# Altium footprint library SAMV71_Xplained_Ultra1.PcbLib: 63 footprints (part 4 of 4)
Each footprint in its own frame and in the unit in brackets; x right, y up, seen from the top. Pads: shape width x height; smd on the part's side, far side on the other; paste and mask are expansions set on the pad; w line width, h text height; cw(c..) or ccw(c..) is an arc to the next point about the centre after c.
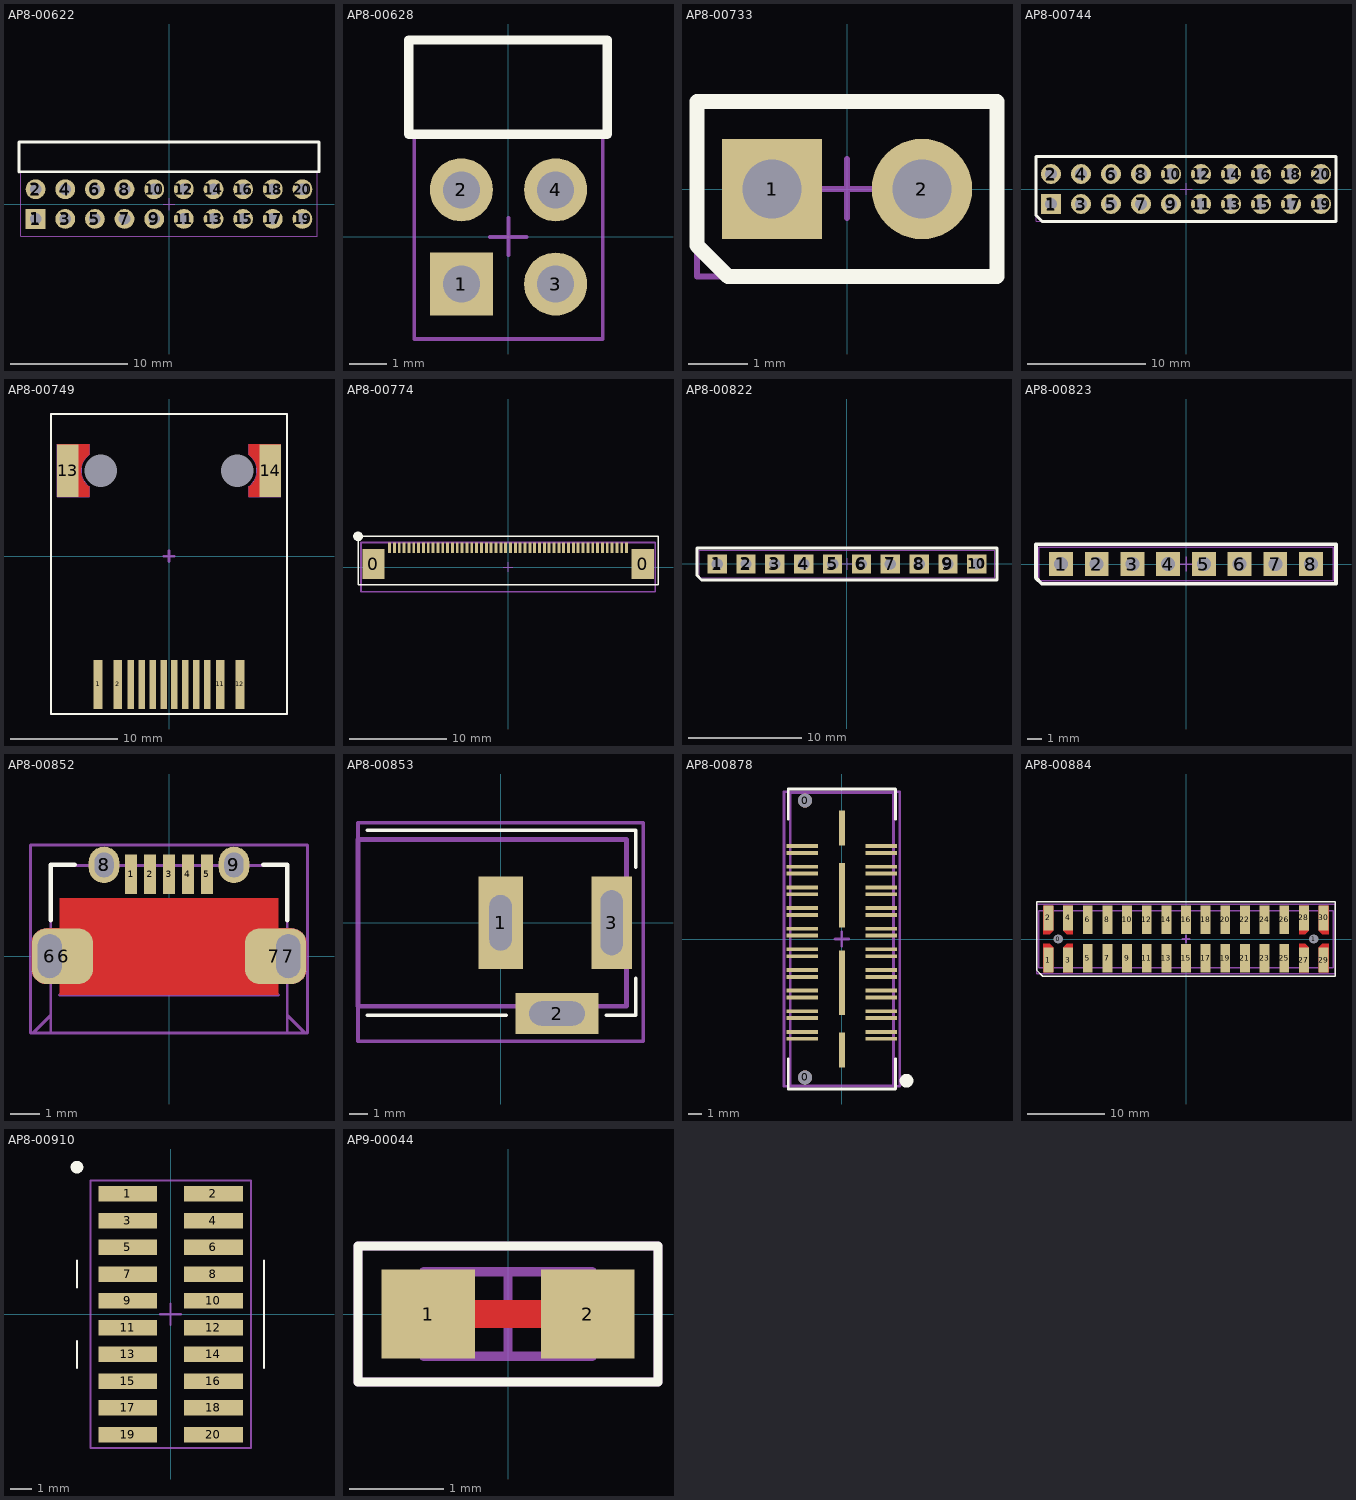
[diagram p3: the footprints below, top view; thin cyan lines are the x and y axes]

## AP8-00525 [mm]
3D body: height 8.97, standoff 3, extent -2.49,-1.22 2.49,1.22

## AP8-00622 [mm]
pads (40):
  rect 1.7x1.7 / inner round 1.7 / far side rect 1.7x1.7 hole 1: 1(-11.43,-1.27)
  rect 2.1x2.1 on Top Paste: 1(-11.43,-1.27) 2(-11.43,1.27) 3(-8.89,-1.27) 4(-8.89,1.27) 5(-6.35,-1.27) 6(-6.35,1.27) 7(-3.81,-1.27) 8(-3.81,1.27) 9(-1.27,-1.27) 10(-1.27,1.27) 11(1.27,-1.27) 12(1.27,1.27) 13(3.81,-1.27) 14(3.81,1.27) 15(6.35,-1.27) 16(6.35,1.27) 17(8.89,-1.27) 18(8.89,1.27) 19(11.43,-1.27) 20(11.43,1.27)
  round 1.7 hole 1: 2(-11.43,1.27) 3(-8.89,-1.27) 4(-8.89,1.27) 5(-6.35,-1.27) 6(-6.35,1.27) 7(-3.81,-1.27) 8(-3.81,1.27) 9(-1.27,-1.27) 10(-1.27,1.27) 11(1.27,-1.27) 12(1.27,1.27) 13(3.81,-1.27) 14(3.81,1.27) 15(6.35,-1.27) 16(6.35,1.27) 17(8.89,-1.27) 18(8.89,1.27) 19(11.43,-1.27) 20(11.43,1.27)
Top Overlay:
  lines w0.254: -12.852,2.767 -12.852,5.307 ; -12.827,2.77 12.85,2.77 ; -12.827,5.307 12.85,5.307 ; 12.852,2.77 12.852,5.31
Mechanical 15:
  lines w0.1: -12.827,5.334 12.7,5.327 ; -0.508,0 0.508,0 ; 0,-0.508 0,0.508 ; -12.7,-2.75 -12.7,2.75 12.7,2.75 12.7,-2.75 -12.7,-2.75
3D body: height 5, standoff -3, extent -12.7,-1.586 12.7,11.294

## AP8-00628 [mm]
pads (8):
  rect 1.7x1.7 / inner round 1.7 / far side rect 1.7x1.7 hole 1: 1(-1.27,-1.27)
  rect 2.1x2.1 on Top Paste: 1(-1.27,-1.27) 2(-1.27,1.27) 3(1.27,-1.27) 4(1.27,1.27)
  round 1.7 hole 1: 2(-1.27,1.27) 3(1.27,-1.27) 4(1.27,1.27)
Top Overlay:
  lines w0.254: -2.692,2.767 -2.692,5.307 ; -2.667,2.77 2.667,2.77 2.667,5.307 -2.667,5.307
Mechanical 15:
  lines w0.1: -2.667,5.334 2.667,5.334 ; -0.508,0 0.492,0 ; 0,-0.492 0,0.508 ; -2.54,-2.75 -2.54,2.75 2.54,2.75 2.54,-2.75 -2.54,-2.75
3D body: height 5, standoff -3, extent -2.54,-1.524 2.54,11.356

## AP8-00733 [mm]
pads (4):
  rect 1.7x1.7 / inner round 1.7 / far side rect 1.7x1.7 hole 1: 1(-1.27,0)
  rect 2.1x2.1 on Top Paste: 1(-1.27,0) 2(1.27,0)
  round 1.7 hole 1: 2(1.27,0)
Top Overlay:
  lines w0.254: -2.54,-0.955 -2.015,-1.48 2.54,-1.48 2.54,1.48 -2.54,1.48 -2.54,-0.955
Mechanical 15:
  lines w0.1: -0.475,0 0.525,0 ; 0,-0.492 0,0.508 ; -2.54,-1.48 -2.54,1.48 2.54,1.48 2.54,-1.48 -2.54,-1.48
3D body: height 8.38, standoff -2.92, extent -2.54,-1.27 2.54,1.27

## AP8-00744 [mm]
pads (40):
  rect 1.7x1.7 / inner round 1.7 / far side rect 1.7x1.7 hole 1: 1(-11.43,-1.27)
  rect 2.1x2.1 on Top Paste: 1(-11.43,-1.27) 2(-11.43,1.27) 3(-8.89,-1.27) 4(-8.89,1.27) 5(-6.35,-1.27) 6(-6.35,1.27) 7(-3.81,-1.27) 8(-3.81,1.27) 9(-1.27,-1.27) 10(-1.27,1.27) 11(1.27,-1.27) 12(1.27,1.27) 13(3.81,-1.27) 14(3.81,1.27) 15(6.35,-1.27) 16(6.35,1.27) 17(8.89,-1.27) 18(8.89,1.27) 19(11.43,-1.27) 20(11.43,1.27)
  round 1.7 hole 1: 2(-11.43,1.27) 3(-8.89,-1.27) 4(-8.89,1.27) 5(-6.35,-1.27) 6(-6.35,1.27) 7(-3.81,-1.27) 8(-3.81,1.27) 9(-1.27,-1.27) 10(-1.27,1.27) 11(1.27,-1.27) 12(1.27,1.27) 13(3.81,-1.27) 14(3.81,1.27) 15(6.35,-1.27) 16(6.35,1.27) 17(8.89,-1.27) 18(8.89,1.27) 19(11.43,-1.27) 20(11.43,1.27)
Top Overlay:
  lines w0.254: -12.7,-2.225 -12.7,2.75 12.7,2.75 12.7,-2.75 -12.175,-2.75 -12.7,-2.225
Mechanical 15:
  lines w0.1: -0.475,0 0.525,0 ; 0,-0.492 0,0.508 ; -12.7,-2.75 12.7,-2.75 12.7,2.75 -12.7,2.75 -12.7,-2.75
3D body: height 8.4, standoff -2.52, extent -12.7,-2.54 12.7,2.54

## AP8-00749 [mm]
pads (16):
  rect 0x0 hole 3 unplated: 0(-6.35,7.97) 0(6.35,7.97)
  rect 0.81x4.6 smd: 1(-6.61,-11.95) 2(-4.77,-11.95) 11(4.77,-11.95) 12(6.61,-11.95)
  rect 0.61x4.6 smd: 3(-3.57,-11.95) 4(-2.55,-11.95) 5(-1.53,-11.95) 6(-0.51,-11.95) 7(0.51,-11.95) 8(1.53,-11.95) 9(2.55,-11.95) 10(3.57,-11.95)
  rect 2x4.9 smd: 13(-9.42,7.97) 14(9.42,7.97)
Top Layer:
  region: -10.42,5.52 -10.42,10.42 -7.42,10.42 -7.42,9.484 -7.42,9.485 -7.422,9.484 -7.664,9.284 -7.896,9.003 -8.067,8.681 -8.173,8.333 -8.209,7.97 -8.173,7.607 -8.067,7.259 -7.896,6.937 -7.664,6.656 -7.422,6.456 -7.419,6.46 -7.42,6.46 -7.42,5.52
  region: 7.42,5.52 7.42,6.456 7.422,6.456 7.664,6.656 7.896,6.937 8.067,7.259 8.173,7.607 8.209,7.97 8.173,8.333 8.067,8.681 7.896,9.003 7.664,9.284 7.422,9.484 7.419,9.48 7.42,9.48 7.42,10.42 10.42,10.42 10.42,5.52
Top Overlay:
  lines w0.2: -11,-14.7 -11,13.25 11,13.25 11,-14.7 -11,-14.7
Mechanical 15:
  lines w0.2: -11,-14.7 11,-14.7 11,13.25 -11,13.25 -11,-14.7
  lines w0.254: -0.5,0 0.5,0 ; 0,-0.5 0,0.5
Mechanical 16:
  lines w0.1: -7.42,6.46 -7.42,5.52 -10.42,5.52 -10.42,10.42 -7.42,10.42 -7.42,9.48 ; -7.419,6.46 cw(c-6.35,7.97) -7.419,9.48 ; 7.419,6.46 ccw(c6.35,7.97) 7.419,9.48 ; 7.42,6.46 7.42,5.52 10.42,5.52 10.42,10.42 7.42,10.42 7.42,9.48
3D body: height 15.2, standoff -1.01, extent -9.65,-13.345 9.65,13.405

## AP8-00774 [mm]
pads (52):
  rect 2.3x3.1 smd: 0(-13.92,0.3) 0(13.92,0.3)
  rect 0.3x1.1 smd: 1(-12.25,2) 2(-11.75,2) 3(-11.25,2) 4(-10.75,2) 5(-10.25,2) 6(-9.75,2) 7(-9.25,2) 8(-8.75,2) 9(-8.25,2) 10(-7.75,2) 11(-7.25,2) 12(-6.75,2) 13(-6.25,2) 14(-5.75,2) 15(-5.25,2) 16(-4.75,2) 17(-4.25,2) 18(-3.75,2) 19(-3.25,2) 20(-2.75,2) 21(-2.25,2) 22(-1.75,2) 23(-1.25,2) 24(-0.75,2) 25(-0.25,2) 26(0.25,2) 27(0.75,2) 28(1.25,2) 29(1.75,2) 30(2.25,2) 31(2.75,2) 32(3.25,2) 33(3.75,2) 34(4.25,2) 35(4.75,2) 36(5.25,2) 37(5.75,2) 38(6.25,2) 39(6.75,2) 40(7.25,2) 41(7.75,2) 42(8.25,2) 43(8.75,2) 44(9.25,2) 45(9.75,2) 46(10.25,2) 47(10.75,2) 48(11.25,2) 49(11.75,2) 50(12.25,2)
Top Overlay:
  circle w1: c-15.507,3.175 r0.007
  lines w0.15: -15.5,-1.85 -15.5,3.175 15.5,3.175 15.5,-1.85 -15.5,-1.85
Mechanical 15:
  lines w0.1: -0.5,0 0.5,0 ; 0,-0.5 0,0.5
  lines w0.2: -15.215,-2.55 -15.215,2.55 15.215,2.55 15.215,-2.55 -15.215,-2.55
3D body: height 2.03, standoff -0.02, extent -15.215,-2.555 15.215,2.555

## AP8-00822 [mm]
pads (20):
  rect 1.7x1.7 / inner round 1.7 / far side round 1.7 hole 1: 1(-11.43,0) 2(-8.89,0) 3(-6.35,0) 4(-3.81,0) 5(-1.27,0) 6(1.27,0) 7(3.81,0) 8(6.35,0) 9(8.89,0) 10(11.43,0)
  rect 2.1x2.1 on Top Paste: 1(-11.43,0) 2(-8.89,0) 3(-6.35,0) 4(-3.81,0) 5(-1.27,0) 6(1.27,0) 7(3.81,0) 8(6.35,0) 9(8.89,0) 10(11.43,0)
Top Overlay:
  lines w0.254: -13.208,-0.992 -13.208,1.397 13.208,1.397 13.208,-1.397 -12.803,-1.397 -13.208,-0.992
Mechanical 15:
  lines w0.1: -0.495,0 0.505,0 ; 0.005,-0.5 0.005,0.5 ; -13,-1.2 13,-1.2 13,1.2 -13,1.2 -13,-1.2
3D body: height 8.51, standoff -2.64, extent -12.954,-1.206 12.954,1.207

## AP8-00823 [mm]
pads (16):
  rect 1.7x1.7 / inner round 1.7 / far side round 1.7 hole 1: 1(-8.89,0) 2(-6.35,0) 3(-3.81,0) 4(-1.27,0) 5(1.27,0) 6(3.81,0) 7(6.35,0) 8(8.89,0)
  rect 2.1x2.1 on Top Paste: 1(-8.89,0) 2(-6.35,0) 3(-3.81,0) 4(-1.27,0) 5(1.27,0) 6(3.81,0) 7(6.35,0) 8(8.89,0)
Top Overlay:
  lines w0.254: -10.668,-0.992 -10.263,-1.397 10.668,-1.397 10.668,1.397 -10.668,1.397 -10.668,-0.992
Mechanical 15:
  lines w0.1: -0.495,0 0.505,0 ; 0.005,-0.5 0.005,0.5 ; -10.46,-1.2 -10.46,1.2 10.46,1.2 10.46,-1.2 -10.46,-1.2
3D body: height 8.51, standoff -2.64, extent -10.414,-1.206 10.414,1.207

## AP8-00852 [mm]
pads (13):
  rect 0.4x1.35 smd: 1(-1.3,2.8) 2(-0.65,2.8) 3(0,2.8) 4(0.65,2.8) 5(1.3,2.8)
  rrect52% 2.1x1.9 hole 0.825 slot 1.5 at 90 deg copper offset 0.437,0: 6(-4.088,0)
  rrect50% 2.1x1.9 on Top Paste: 6(-3.6,0) 7(3.6,0)
  rrect52% 2.1x1.9 hole 0.825 slot 1.5 at 90 deg copper offset -0.437,0: 7(4.088,0)
  rrect100% 1.05x1.25 hole 0.65 slot 0.85 at 90 deg: 8(-2.225,3.125) 9(2.225,3.125)
  rrect50% 1.05x1.25 on Top Paste: 8(-2.225,3.125) 9(2.225,3.125)
Top Layer:
  rectangle: 0.25,-0.95 2.05,0.95
  rectangle: -2.05,-0.95 -0.25,0.95
  region: 2.6,-0.95 4.2,-0.95 4.294,-0.941 4.381,-0.915 4.434,-0.891 4.48,-0.862 4.52,-0.832 4.565,-0.791 4.596,-0.753 4.622,-0.716 4.647,-0.673 4.66,-0.64 4.676,-0.6 4.688,-0.55 4.696,-0.505 4.7,-0.45 4.7,0.45 4.696,0.503 4.689,0.548 4.677,0.599 4.661,0.641 4.641,0.683 4.617,0.724 4.589,0.761 4.56,0.797 4.521,0.831 4.483,0.86 4.439,0.888 4.397,0.908 4.354,0.924 4.301,0.939 4.248,0.946 4.2,0.95 2.6,0.95
  region: -2.6,0.95 -4.2,0.95 -4.294,0.941 -4.381,0.915 -4.434,0.891 -4.48,0.862 -4.52,0.832 -4.565,0.791 -4.596,0.753 -4.622,0.716 -4.647,0.673 -4.66,0.64 -4.676,0.6 -4.688,0.55 -4.696,0.505 -4.7,0.45 -4.7,-0.45 -4.696,-0.503 -4.689,-0.548 -4.677,-0.599 -4.661,-0.641 -4.641,-0.683 -4.617,-0.724 -4.589,-0.761 -4.56,-0.797 -4.521,-0.831 -4.483,-0.86 -4.439,-0.888 -4.397,-0.908 -4.354,-0.924 -4.301,-0.939 -4.248,-0.946 -4.2,-0.95 -2.6,-0.95
  pour cut-out: -3.75,1.975 3.75,1.975 3.75,-1.325 -3.75,-1.325
Bottom Layer:
  region: -2.6,0.95 -4.2,0.95 -4.294,0.941 -4.381,0.915 -4.434,0.891 -4.48,0.862 -4.52,0.832 -4.565,0.791 -4.596,0.753 -4.622,0.716 -4.647,0.673 -4.66,0.64 -4.676,0.6 -4.688,0.55 -4.696,0.505 -4.7,0.45 -4.7,-0.45 -4.696,-0.503 -4.689,-0.548 -4.677,-0.599 -4.661,-0.641 -4.641,-0.683 -4.617,-0.724 -4.589,-0.761 -4.56,-0.797 -4.521,-0.831 -4.483,-0.86 -4.439,-0.888 -4.397,-0.908 -4.354,-0.924 -4.301,-0.939 -4.248,-0.946 -4.2,-0.95 -2.6,-0.95
  region: 2.6,-0.95 4.2,-0.95 4.294,-0.941 4.381,-0.915 4.434,-0.891 4.48,-0.862 4.52,-0.832 4.565,-0.791 4.596,-0.753 4.622,-0.716 4.647,-0.673 4.66,-0.64 4.676,-0.6 4.688,-0.55 4.696,-0.505 4.7,-0.45 4.7,0.45 4.696,0.503 4.689,0.548 4.677,0.599 4.661,0.641 4.641,0.683 4.617,0.724 4.589,0.761 4.56,0.797 4.521,0.831 4.483,0.86 4.439,0.888 4.397,0.908 4.354,0.924 4.301,0.939 4.248,0.946 4.2,0.95 2.6,0.95
Top Overlay:
  lines w0.15: -4.05,1.225 -4.05,3.125 -3.225,3.125 ; 3.225,3.125 4.05,3.125 4.05,1.225
Mechanical 1:
  lines w0.1: -3.75,-1.325 3.75,-1.325
Mechanical 13:
  lines w0.1: -4.05,-2.025 -4.65,-2.625 -4.05,-2.625 ; 4.05,-2.025 4.65,-2.625 4.05,-2.625 ; -4.05,-2.625 4.05,-2.625 ; -4.05,-2.625 -4.05,3.1 4.05,3.1 4.05,-2.625
Mechanical 15:
  lines w0.1: -0.25,0 0.25,0 ; 0,-0.25 0,0.25 ; -4.75,-2.625 4.75,-2.625 4.75,3.8 -4.75,3.8 -4.75,-2.625
3D body: height 2.78, standoff -0.61, extent -4.325,-2.649 4.325,3.25

## AP8-00853 [mm]
pads (3):
  rect 2.4x5 hole 1.2 slot 3 at 90 deg: 1(0,0)
  rect 4.5x2.2 hole 1.3 slot 3 at 0 deg: 2(3.05,-4.9)
  rect 2.2x5 hole 1.2 slot 3.5 at 90 deg: 3(6,0)
Top Overlay:
  lines w0.2: -7.2,-5 0.3,-5 ; -7.2,5 7.3,5 7.3,3 ; 5.7,-5 7.3,-5 7.3,-3
Mechanical 1:
  lines w0.254: -7.7,-4.5 -7.7,4.5
Mechanical 13:
  lines w0.254: -7.7,-4.5 6.8,-4.5 6.8,4.5 -7.7,4.5 -7.7,-4.5
Mechanical 15:
  lines w0.2: -0.5,0 0.5,0 ; 0,-0.5 0,0.5 ; -7.7,-6.4 -7.7,5.4 7.7,5.4 7.7,-6.4 -7.7,-6.4
3D body: height 11.18, standoff -3.6, extent -7.6,-5 6.878,4.472

## AP8-00878 [mm]
pads (46):
  round 1.02 hole 1.02 unplated: 0(-2.67,-10.06) 0(-2.67,10.06)
  rect 2.27x0.28 smd: 1(2.87,-7.25) 2(-2.87,-7.25) 3(2.87,-6.75) 4(-2.87,-6.75) 5(2.87,-5.75) 6(-2.87,-5.75) 7(2.87,-5.25) 8(-2.87,-5.25) 9(2.87,-4.25) 10(-2.87,-4.25) 11(2.87,-3.75) 12(-2.87,-3.75) 13(2.87,-2.75) 14(-2.87,-2.75) 15(2.87,-2.25) 16(-2.87,-2.25) 17(2.87,-1.25) 18(-2.87,-1.25) 19(2.87,-0.75) 20(-2.87,-0.75) 21(2.87,0.25) 22(-2.87,0.25) 23(2.87,0.75) 24(-2.87,0.75) 25(2.87,1.75) 26(-2.87,1.75) 27(2.87,2.25) 28(-2.87,2.25) 29(2.87,3.25) 30(-2.87,3.25) 31(2.87,3.75) 32(-2.87,3.75) 33(2.87,4.75) 34(-2.87,4.75) 35(2.87,5.25) 36(-2.87,5.25) 37(2.87,6.25) 38(-2.87,6.25) 39(2.87,6.75) 40(-2.87,6.75)
  rect 0.43x2.54 smd: 41(0,-8.065) 44(0,8.065)
  rect 0.43x4.7 smd: 42(0,-3.175) 43(0,3.175)
Top Overlay:
  circle w0.5: c4.7,-10.3 r0.25
  lines w0.2: -3.9,-8.7 -3.9,-10.9 3.9,-10.9 3.9,-8.7 ; -3.9,8.7 -3.9,10.9 3.9,10.9 3.9,8.7
Mechanical 13:
  lines w0.2: -3.747,-10.674 3.746,-10.674 3.746,10.636 -3.747,10.636 -3.747,-10.674
Mechanical 15:
  lines w0.2: -0.5,0 0.5,0 ; 0,-0.5 0,0.5 ; -4.2,-10.7 4.2,-10.7 4.2,10.7 -4.2,10.7 -4.2,-10.7
3D body: height 3.05, standoff -0.95, extent -3.747,-10.674 3.746,10.636

## AP8-00884 [mil]
pads (32):
  round 39.37 hole 46.85 unplated: 0(-650,0) 1(650,0)
  rect 50x125.98 smd: 1(-700,-107.01) 2(-700,107.01) 3(-600,-107.01) 4(-600,107.01) 27(600,-107.01) 28(600,107.01) 29(700,-107.01) 30(700,107.01)
  rect 50x145 smd: 5(-500,-97.5) 6(-500,97.5) 7(-400,-97.5) 8(-400,97.5) 9(-300,-97.5) 10(-300,97.5) 11(-200,-97.5) 12(-200,97.5) 13(-100,-97.5) 14(-100,97.5) 15(0,-97.5) 16(0,97.5) 17(100,-97.5) 18(100,97.5) 19(200,-97.5) 20(200,97.5) 21(300,-97.5) 22(300,97.5) 23(400,-97.5) 24(400,97.5) 25(500,-97.5) 26(500,97.5)
Top Layer:
  region: 575,-169.88 575,-25 607.28,-25 625,-42.72 625,-169.88
  region: 725,-169.88 725,-25 692.72,-25 675,-42.72 675,-169.88
  region: 575,169.88 575,25 607.28,25 625,42.72 625,169.88
  region: 725,169.88 725,25 692.72,25 675,42.72 675,169.88
  region: -575,169.88 -575,25 -607.28,25 -625,42.72 -625,169.88
  region: -725,169.88 -725,25 -692.72,25 -675,42.72 -675,169.88
  region: -575,-169.88 -575,-25 -607.28,-25 -625,-42.72 -625,-169.88
  region: -725,-169.88 -725,-25 -692.72,-25 -675,-42.72 -675,-169.88
Top Overlay:
  lines w7.87: -759.84,-157.48 -728.35,-188.98 759.84,-188.98 759.84,188.98 -759.84,188.98 -759.84,-157.48
Mechanical 13:
  lines w7.87: -750,-145.33 750,-145.33 750,144.67 -750,144.67 -750,-145.33
Mechanical 15:
  lines w7.87: -19.68,0 19.68,0 ; 0,-19.68 0,19.68 ; -759.84,-177.17 -759.84,177.17 759.84,177.17 759.84,-177.17 -759.84,-177.17
3D body: height 380, standoff -60, extent -750,-145.33 750,144.67

## AP8-00910 [mm]
pads (20):
  rect 2.79x0.74 smd: 1(-2.035,5.715) 2(2.035,5.715) 3(-2.035,4.445) 4(2.035,4.445) 5(-2.035,3.175) 6(2.035,3.175) 7(-2.035,1.905) 8(2.035,1.905) 9(-2.035,0.635) 10(2.035,0.635) 11(-2.035,-0.635) 12(2.035,-0.635) 13(-2.035,-1.905) 14(2.035,-1.905) 15(-2.035,-3.175) 16(2.035,-3.175) 17(-2.035,-4.445) 18(2.035,-4.445) 19(-2.035,-5.715) 20(2.035,-5.715)
Top Overlay:
  circle w0.3: c-4.445,6.985 r0.15
  lines w0.1: -4.445,-2.54 -4.445,-1.27 ; -4.445,1.27 -4.445,2.54 ; 4.445,-2.54 4.445,2.54
Mechanical 15:
  lines w0.1: -0.5,0 0.5,0 ; 0,-0.5 0,0.5 ; -3.81,-6.35 3.81,-6.35 3.81,6.35 -3.81,6.35 -3.81,-6.35
3D body: height 6.11, standoff -0.01, extent -2.921,-6.312 2.921,6.312

## AP9-00044 [mm]
pads (2):
  rect 1x0.95 smd paste-1: 1(-0.85,0) 2(0.85,0)
Top Layer:
  rectangle: -0.45,-0.15 0.45,0.15
Top Overlay:
  lines w0.1: -1.6,-0.725 1.6,-0.725 1.6,0.725 -1.6,0.725 -1.6,-0.725
Top Solder:
  rectangle: -0.45,-0.25 0.45,0.26
Mechanical 13:
  lines w0.1: -0.9,-0.45 0.9,-0.45 0.9,0.45 -0.9,0.45 -0.9,-0.45
Mechanical 15:
  lines w0.1: -0.45,0 0.45,0 ; 0,-0.45 0,0.45 ; -1.6,-0.725 1.6,-0.725 1.6,0.725 -1.6,0.725 -1.6,-0.725
3D body: height 0.3, standoff 0, extent -0.8,-0.4 0.8,0.4